# Altium footprint library Connectors.PcbLib: 101 footprints (part 3 of 7)
Each footprint in its own frame and in the unit in brackets; x right, y up, seen from the top. Pads: shape width x height; smd on the part's side, far side on the other; paste and mask are expansions set on the pad; w line width, h text height; cw(c..) or ccw(c..) is an arc to the next point about the centre after c.
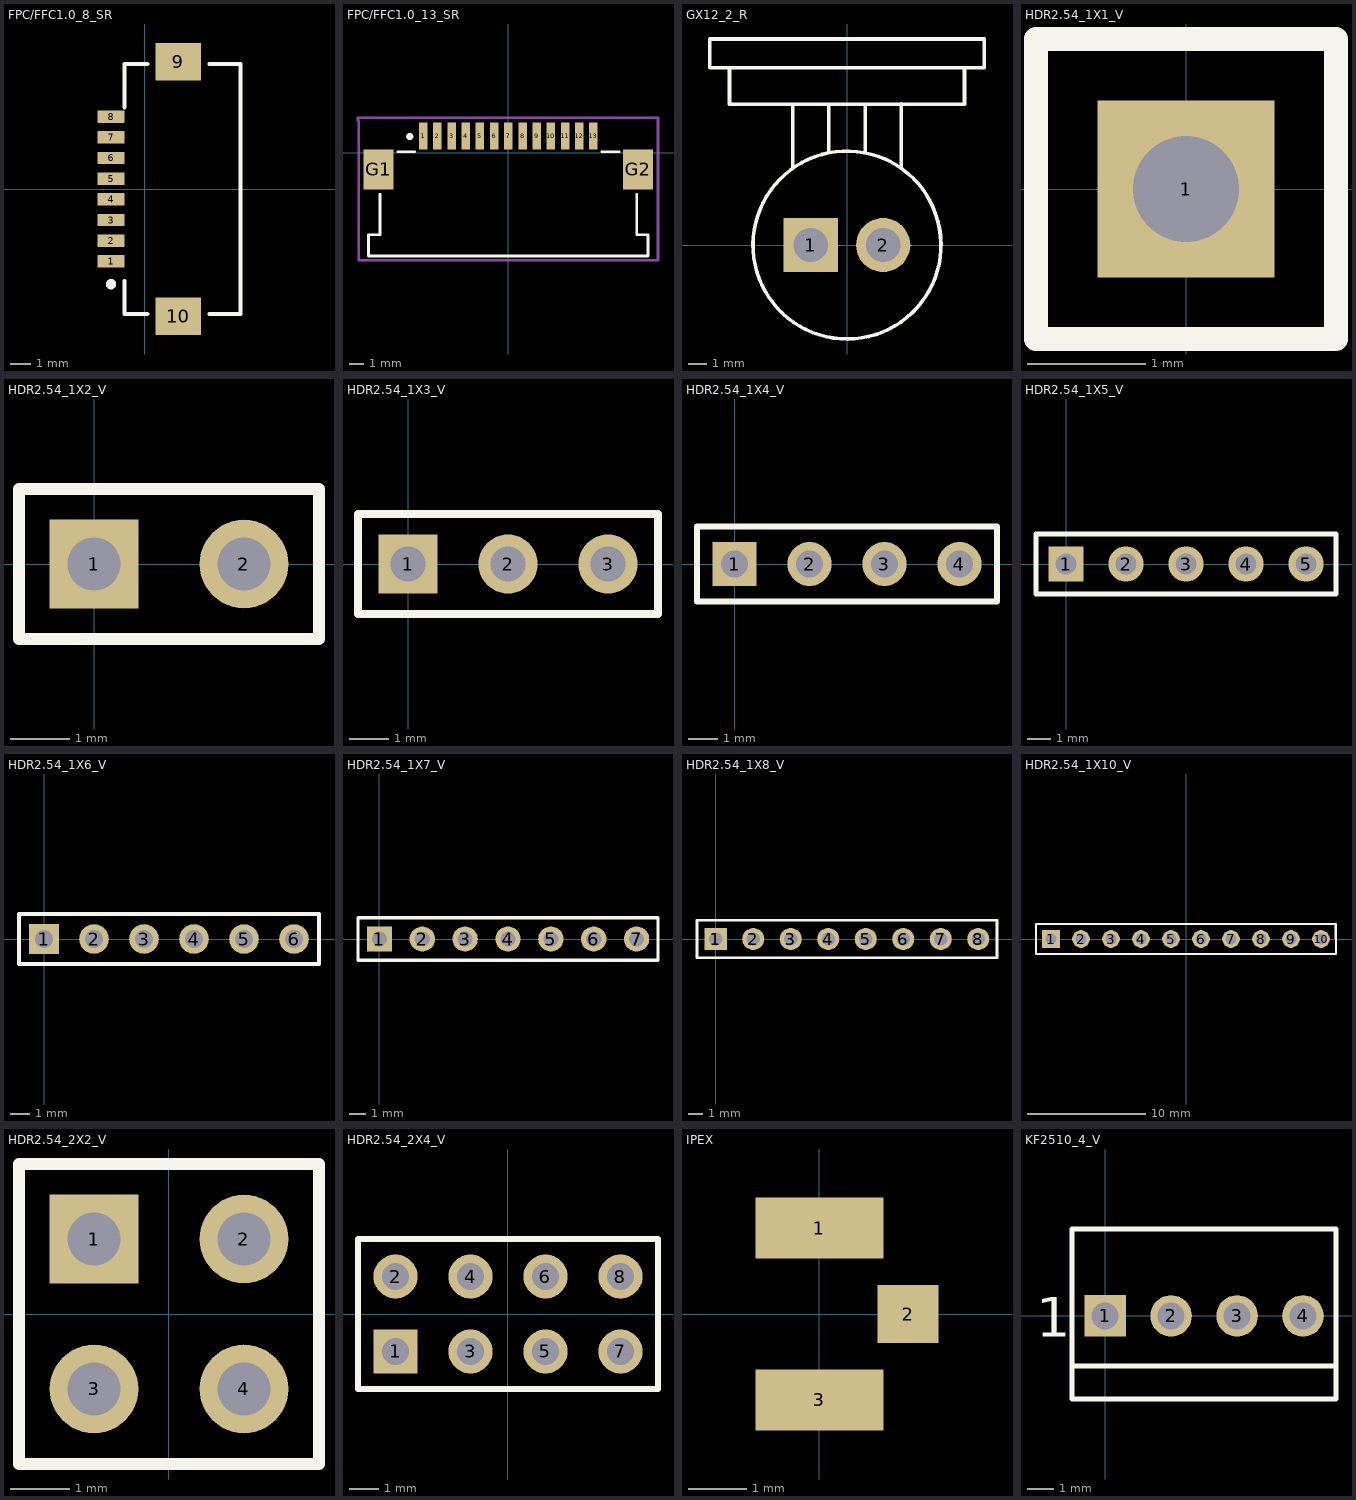
[diagram p2: the footprints below, top view; thin cyan lines are the x and y axes]

## FPC/FFC1.0_8_SR [mm] "FPC/FFC Connector，1.0mm Pitch，8Pin，Surface mount, Right Angle"
pads (10):
  rect 1.3x0.6 smd: 1(-1.625,-3.5) 2(-1.625,-2.5) 3(-1.625,-1.5) 4(-1.625,-0.5) 5(-1.625,0.5) 6(-1.625,1.5) 7(-1.625,2.5) 8(-1.625,3.5)
  rect 2.2x1.8 smd: 9(1.625,6.15) 10(1.625,-6.15)
Top Overlay:
  circle w0.25: c-1.625,-4.6 r0.125
  lines w0.2: -0.975,-4.45 -0.975,-6.05 0.125,-6.05 ; -0.975,3.95 -0.975,6.05 0.125,6.05 ; 3.125,-6.05 4.625,-6.05 4.625,6.05 3.125,6.05
3D body "19r9649_84952-8.stp": height 2.54, standoff -0.02, extent -2.27,-7.965 4.27,7.965

## FPC/FFC1.0_13_SR [mm] "FPC/FFC Connector，1.0mm Pitch，13Pin，Surface mount, Right Angle"
pads (15):
  rect 0.6x1.9 smd paste+0 mask+0.1: 1(-6,1.175) 2(-5,1.175) 3(-4,1.175) 4(-3,1.175) 5(-2,1.175) 6(-1,1.175) 7(0,1.175) 8(1,1.175) 9(2,1.175) 10(3,1.175) 11(4,1.175) 12(5,1.175) 13(6,1.175)
  rect 2.1x2.8 smd paste+0 mask+0.1: G1(-9.15,-1.175) G2(9.15,-1.175)
Top Overlay:
  circle w0.25: c-6.95,1.15 r0.125
  lines w0.2: -9.05,-2.925 -9.05,-5.775 -9.85,-5.775 -9.85,-7.275 9.85,-7.275 9.85,-5.775 9.05,-5.775 9.05,-2.925 ; -7.8,0.075 -6.6,0.075 ; 6.6,0.075 7.8,0.075
Mechanical 15:
  lines w0.2: -10.6,2.265 -10.55,2.215 -10.55,-7.575 10.55,-7.575 10.55,2.475 -10.6,2.475 -10.6,2.265
3D body "522071333.stp": height 2.7, standoff 0, extent -9.68,-7.165 9.62,1.735

## GX12_2_R [mm]
pads (2):
  rect 3x3 hole 1.9 paste+0 mask+0.1: 1(-2,0)
  round 3 hole 1.9 paste+0 mask+0.1: 2(2,0)
Top Overlay:
  lines w0.2: -6.5,9.79 -6.5,7.8 6.5,7.8 6.5,9.79 ; -3,4.3 -3,7.78 ; -1,5.1 -1,7.78 ; 1,5.1 1,7.67 ; 3,4.3 3,7.82 ; 5.198,0.128 cw(c0,0) 5.198,0.139 ; -7.6,9.8 -7.6,11.4 7.6,11.4 7.6,9.8 -7.6,9.8
3D body "gx12-2.stp": height 14, standoff -3.5, extent -7.5,-5.01 7.5,24.59

## HDR2.54_1X1_V [mm] "Header, 2.54mm Pitch，541-Pin, Single row, Vertical"
pads (1):
  rect 1.5x1.5 hole 0.9: 1(0,0)
Top Overlay:
  lines w0.2: -1.27,-1.27 1.27,-1.27 1.27,1.27 -1.27,1.27 -1.27,-1.27
3D body "HDR1X1_2.54mm.STEP": height 8.54, standoff -3, extent -1.27,-1.27 1.27,1.27

## HDR2.54_1X2_V [mm] "Header, 2.54mm Pitch，2-Pin, Single row, Vertical"
pads (2):
  rect 1.5x1.5 hole 0.9: 1(0,0)
  round 1.5 hole 0.9: 2(2.54,0)
Top Overlay:
  lines w0.2: -1.27,-1.27 -1.27,1.27 3.81,1.27 3.81,-1.27 -1.27,-1.27
3D body "HDR1X2_2.54mm.STEP": height 8.54, standoff -3, extent -1.27,-1.27 3.81,1.27

## HDR2.54_1X3_V [mm] "Header, 2.54mm Pitch，3-Pin, Single row, Vertical"
pads (3):
  rect 1.5x1.5 hole 0.9: 1(0,0)
  round 1.5 hole 0.9: 2(2.54,0) 3(5.08,0)
Top Overlay:
  lines w0.2: -1.27,-1.27 -1.27,1.27 6.35,1.27 6.35,-1.27 -1.27,-1.27
3D body "HDR1X3_2.54mm.STEP": height 8.54, standoff -3, extent -1.27,-1.27 6.35,1.27

## HDR2.54_1X4_V [mm] "Header, 2.54mm Pitch，4-Pin, Single row, Vertical"
pads (4):
  rect 1.5x1.5 hole 0.9: 1(0,0)
  round 1.5 hole 0.9: 2(2.54,0) 3(5.08,0) 4(7.62,0)
Top Overlay:
  lines w0.2: -1.27,-1.27 -1.27,1.27 8.89,1.27 8.89,-1.27 -1.27,-1.27
3D body "HDR1X4_2.54mm.STEP": height 8.54, standoff -3, extent -1.27,-1.27 8.89,1.27

## HDR2.54_1X5_V [mm] "Header, 2.54mm Pitch，5-Pin, Single row, Vertical"
pads (5):
  rect 1.5x1.5 hole 0.9: 1(0,0)
  round 1.5 hole 0.9: 2(2.54,0) 3(5.08,0) 4(7.62,0) 5(10.16,0)
Top Overlay:
  lines w0.2: -1.27,-1.27 -1.27,1.27 11.43,1.27 11.43,-1.27 -1.27,-1.27
3D body "HDR1X5_2.54mm.STEP": height 8.54, standoff -3, extent -1.27,-1.27 11.43,1.27

## HDR2.54_1X6_V [mm] "Header, 2.54mm Pitch，6-Pin, Single row, Vertical"
pads (6):
  rect 1.5x1.5 hole 0.9: 1(0,0)
  round 1.5 hole 0.9: 2(2.54,0) 3(5.08,0) 4(7.62,0) 5(10.16,0) 6(12.7,0)
Top Overlay:
  lines w0.2: -1.27,-1.27 -1.27,1.27 13.97,1.27 13.97,-1.27 -1.27,-1.27
3D body "HDR1X6_2.54mm.STEP": height 8.54, standoff -3, extent -1.27,-1.27 13.97,1.27

## HDR2.54_1X7_V [mm] "Header, 2.54mm Pitch，7-Pin, Single row, Vertical"
pads (7):
  rect 1.5x1.5 hole 0.9: 1(0,0)
  round 1.5 hole 0.9: 2(2.54,0) 3(5.08,0) 4(7.62,0) 5(10.16,0) 6(12.7,0) 7(15.24,0)
Top Overlay:
  lines w0.2: -1.27,-1.27 -1.27,1.27 16.51,1.27 16.51,-1.27 -1.27,-1.27
3D body "HDR1X7_2.54mm.STEP": height 8.54, standoff -3, extent -1.27,-1.27 16.51,1.27

## HDR2.54_1X8_V [mm] "Header, 2.54mm Pitch，8-Pin, Single row, Vertical"
pads (8):
  rect 1.5x1.5 hole 0.9: 1(0,0)
  round 1.5 hole 0.9: 2(2.54,0) 3(5.08,0) 4(7.62,0) 5(10.16,0) 6(12.7,0) 7(15.24,0) 8(17.78,0)
Top Overlay:
  lines w0.2: -1.27,-1.27 19.05,-1.27 19.05,1.27 -1.27,1.27 -1.27,-1.27
3D body "HDR1X8_2.54mm.STEP": height 8.54, standoff -3, extent -1.27,-1.27 19.05,1.27

## HDR2.54_1X10_V [mm]
pads (10):
  rect 1.5x1.5 hole 0.9: 1(-11.43,0)
  round 1.5 hole 0.9: 2(-8.89,0) 3(-6.35,0) 4(-3.81,0) 5(-1.27,0) 6(1.27,0) 7(3.81,0) 8(6.35,0) 9(8.89,0) 10(11.43,0)
Top Overlay:
  lines w0.2: 12.67,-1.27 -12.7,-1.27 -12.7,1.27 12.67,1.27 12.7,-1.27
3D body "User Library-Header_Male_10Pin.STEP": height 8.54, standoff -3, extent -12.7,-1.245 12.7,1.245
3D body: height 0.25, standoff 0, extent -2.75,-0.36 -2.75,-0.36

## HDR2.54_2X2_V [mm] "Header, 2.54mm Pitch，8-Pin, Dual row, Vertical"
pads (4):
  rect 1.5x1.5 hole 0.9: 1(-1.27,1.27)
  round 1.5 hole 0.9: 2(1.27,1.27) 3(-1.27,-1.27) 4(1.27,-1.27)
Top Overlay:
  lines w0.2: -2.54,-2.54 -2.54,2.54 2.54,2.54 2.54,-2.54 -2.54,-2.54
3D body "Pin-Header-2.54-Double-4.stp": height 8.5, standoff -3, extent -2.54,-2.54 2.54,2.54

## HDR2.54_2X4_V [mm] "Header, 2.54mm Pitch，8-Pin, dual row, Vertical"
pads (8):
  rect 1.5x1.5 hole 0.9: 1(-3.81,-1.27)
  round 1.5 hole 0.9: 2(-3.81,1.27) 3(-1.27,-1.27) 4(-1.27,1.27) 5(1.27,-1.27) 6(1.27,1.27) 7(3.81,-1.27) 8(3.81,1.27)
Top Overlay:
  lines w0.2: -5.08,-2.54 -5.08,2.54 5.08,2.54 5.08,-2.54 -5.08,-2.54
3D body "User Library-Pin Bar 2X4 2_54mm 11_5mm length.STEP": height 8.5, standoff -3, extent -5.08,-2.54 5.08,2.54

## IPEX [mm]
pads (3):
  rect 2.2x1.05 smd paste+0 mask+0.1: 1(0,1.475) 3(0,-1.475)
  rect 1.05x1 smd paste+0 mask+0.1: 2(1.525,0)
3D body "User Library-IPEX.step": height 1.25, standoff -0.01, extent -1.55,-1.5 1.55,1.5

## KF2510_4_V [mm] "KF2510 Connnector, 2.54mm pitch, 4Pin, Vertical"
pads (4):
  rect 1.6x1.6 hole 1.05 paste+0 mask+0.1: 1(0,0)
  round 1.6 hole 1.05 paste+0 mask+0.1: 2(2.54,0) 3(5.08,0) 4(7.62,0)
Top Overlay:
  lines w0.2: -1.24,-1.93 8.87,-1.93 ; -1.27,-3.2 -1.27,3.35 8.89,3.35 8.89,-3.2 -1.27,-3.2
  text "1" at -2.66,-0.81 h1.52
3D body "022232041.stp": height 11.08, standoff -3.14, extent -1.194,-3.099 8.814,3.251